# Altium footprint library My Footprint 3D.PCBLIB: 447 footprints (part 16 of 29)
Each footprint in its own frame and in the unit in brackets; x right, y up, seen from the top. Pads: shape width x height; smd on the part's side, far side on the other; paste and mask are expansions set on the pad; w line width, h text height; cw(c..) or ccw(c..) is an arc to the next point about the centre after c.
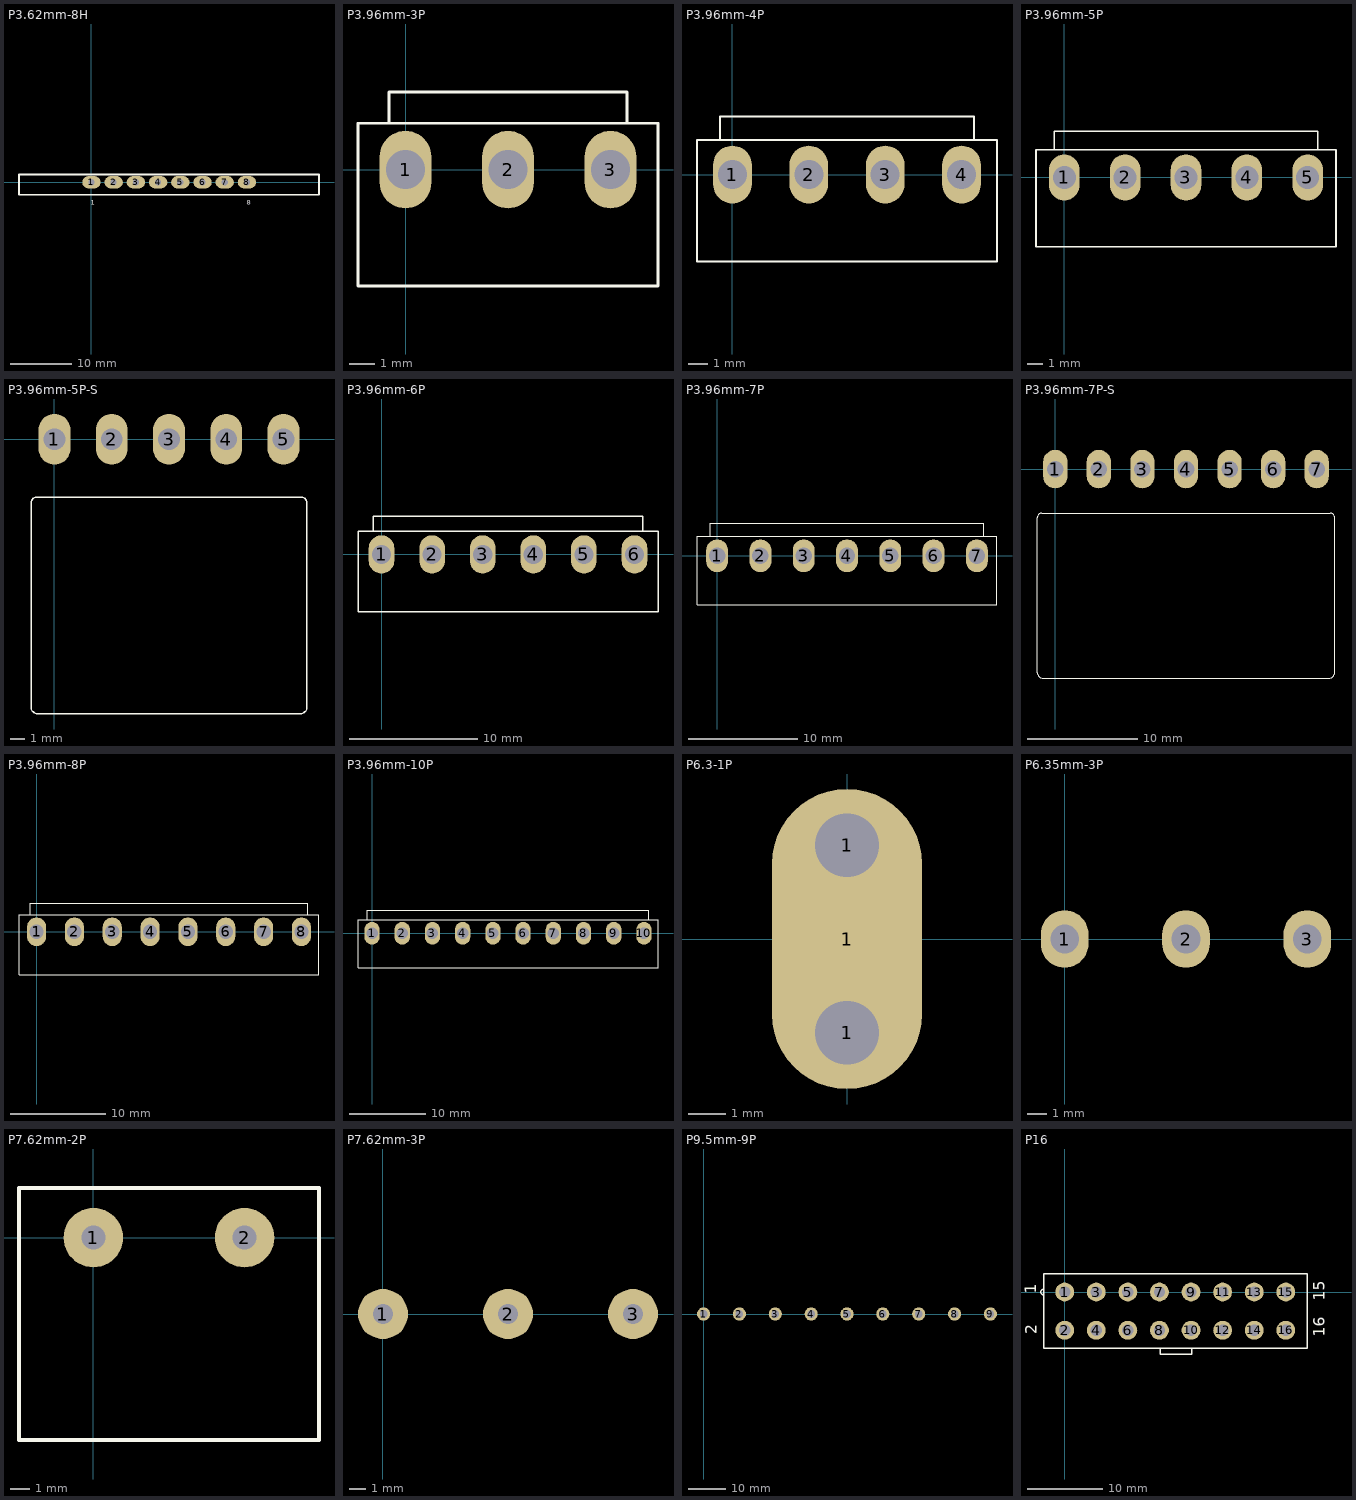
[diagram p15: the footprints below, top view; thin cyan lines are the x and y axes]

## P3.62mm-8H [mm]
pads (8):
  oval 3x2 hole 1: 1(0,0) 2(3.62,0) 3(7.24,0) 4(10.86,0) 5(14.48,0) 6(18.1,0) 7(21.72,0) 8(25.34,0)
Top Overlay:
  lines w0.254: -11.811,-2.032 37.084,-2.032 37.084,1.27 -11.811,1.27 -11.811,-2.032
  text "1" at -0.127,-3.683 h0.8
  text "8" at 25.273,-3.683 h0.8

## P3.96mm-3P [mm] "Distance 3.96mm"
height 10
pads (3):
  oval 2x3 hole 1.5: 1(0,0) 2(3.96,0) 3(7.92,0)
Top Overlay:
  lines w0.1: -0.64,1.8 -1.84,1.8 -1.84,-4.5 9.76,-4.5 9.76,1.8 8.56,1.8 ; -0.64,1.8 -0.64,3 8.56,3 8.56,1.8 ; -0.64,1.8 8.56,1.8
3D body: height 9, standoff 7.5, extent 5.92,3.1 8.82,3.6
3D body: height 9, standoff 0.4, extent 5.92,2 8.82,3.1
3D body: height 3, standoff 0.4, extent 5.92,-4.7 10.02,2
3D body: height 0.4, standoff 0, extent 5.92,-4.7 7.02,3.1
3D body: height 0.4, standoff 0, extent 8.82,-4.7 10.02,2
3D body: height 11.5, standoff -2, extent 7.37,-0.55 8.47,0.55
3D body: height 9, standoff 7.5, extent -0.9,3.1 2,3.6
3D body: height 9, standoff 0.4, extent -0.9,2 2,3.1
3D body: height 3, standoff 0.4, extent -2.1,-4.7 2,2
3D body: height 0.4, standoff 0, extent 0.9,-4.7 2,3.1
3D body: height 0.4, standoff 0, extent -2.1,-4.7 -0.9,2
3D body: height 11.5, standoff -2, extent -0.55,-0.55 0.55,0.55
3D body: height 11.5, standoff -2, extent 3.41,-0.55 4.51,0.55
3D body: height 0.4, standoff 0, extent 1.96,-4.7 3.06,3.1
3D body: height 0.4, standoff 0, extent 4.86,-4.7 5.96,3.1
3D body: height 3, standoff 0.4, extent 1.96,-4.7 5.96,2
3D body: height 9, standoff 0.4, extent 1.96,2 5.96,3.1
3D body: height 9, standoff 7.5, extent 1.96,3.1 5.96,3.6

## P3.96mm-4P [mm] "Distance 3.96mm"
height 10
pads (4):
  oval 2x3 hole 1.5: 1(0,0) 2(3.96,0) 3(7.92,0) 4(11.88,0)
Top Overlay:
  lines w0.1: -0.64,1.8 12.52,1.8 ; -0.64,1.8 -1.84,1.8 -1.84,-4.5 13.72,-4.5 13.72,1.8 12.52,1.8 ; -0.64,1.8 -0.64,3 12.52,3 12.52,1.8
3D body: height 9, standoff 7.5, extent -0.9,3.1 2,3.6
3D body: height 9, standoff 0.4, extent -0.9,2 2,3.1
3D body: height 3, standoff 0.4, extent -2.1,-4.7 2,2
3D body: height 0.4, standoff 0, extent 0.9,-4.7 2,3.1
3D body: height 0.4, standoff 0, extent -2.1,-4.7 -0.9,2
3D body: height 11.5, standoff -2, extent -0.55,-0.55 0.55,0.55
3D body: height 9, standoff 7.5, extent 9.88,3.1 12.78,3.6
3D body: height 9, standoff 0.4, extent 9.88,2 12.78,3.1
3D body: height 3, standoff 0.4, extent 9.88,-4.7 13.98,2
3D body: height 0.4, standoff 0, extent 9.88,-4.7 10.98,3.1
3D body: height 0.4, standoff 0, extent 12.78,-4.7 13.98,2
3D body: height 11.5, standoff -2, extent 11.33,-0.55 12.43,0.55
3D body: height 11.5, standoff -2, extent 3.41,-0.55 4.51,0.55
3D body: height 0.4, standoff 0, extent 1.96,-4.7 3.06,3.1
3D body: height 0.4, standoff 0, extent 4.86,-4.7 5.96,3.1
3D body: height 3, standoff 0.4, extent 1.96,-4.7 5.96,2
3D body: height 9, standoff 0.4, extent 1.96,2 5.96,3.1
3D body: height 9, standoff 7.5, extent 1.96,3.1 5.96,3.6
3D body: height 11.5, standoff -2, extent 7.37,-0.55 8.47,0.55
3D body: height 0.4, standoff 0, extent 5.92,-4.7 7.02,3.1
3D body: height 0.4, standoff 0, extent 8.82,-4.7 9.92,3.1
3D body: height 3, standoff 0.4, extent 5.92,-4.7 9.92,2
3D body: height 9, standoff 0.4, extent 5.92,2 9.92,3.1
3D body: height 9, standoff 7.5, extent 5.92,3.1 9.92,3.6

## P3.96mm-5P [mm]
pads (5):
  oval 2x3 hole 1.5: 1(0,0) 2(3.96,0) 3(7.92,0) 4(11.88,0) 5(15.84,0)
Top Overlay:
  lines w0.1: -0.64,1.8 -0.64,3 16.48,3 16.48,1.8 ; -0.64,1.8 -1.84,1.8 -1.84,-4.5 17.68,-4.5 17.68,1.8 16.48,1.8 ; -0.64,1.8 16.48,1.8
3D body: height 11.5, standoff -2, extent 3.41,-0.55 4.51,0.55
3D body: height 0.4, standoff 0, extent 1.96,-4.7 3.06,3.1
3D body: height 0.4, standoff 0, extent 4.86,-4.7 5.96,3.1
3D body: height 3, standoff 0.4, extent 1.96,-4.7 5.96,2
3D body: height 9, standoff 0.4, extent 1.96,2 5.96,3.1
3D body: height 9, standoff 7.5, extent 1.96,3.1 5.96,3.6
3D body: height 11.5, standoff -2, extent 7.37,-0.55 8.47,0.55
3D body: height 0.4, standoff 0, extent 5.92,-4.7 7.02,3.1
3D body: height 0.4, standoff 0, extent 8.82,-4.7 9.92,3.1
3D body: height 3, standoff 0.4, extent 5.92,-4.7 9.92,2
3D body: height 9, standoff 0.4, extent 5.92,2 9.92,3.1
3D body: height 9, standoff 7.5, extent 5.92,3.1 9.92,3.6
3D body: height 11.5, standoff -2, extent 11.33,-0.55 12.43,0.55
3D body: height 0.4, standoff 0, extent 9.88,-4.7 10.98,3.1
3D body: height 0.4, standoff 0, extent 12.78,-4.7 13.88,3.1
3D body: height 3, standoff 0.4, extent 9.88,-4.7 13.88,2
3D body: height 9, standoff 0.4, extent 9.88,2 13.88,3.1
3D body: height 9, standoff 7.5, extent 9.88,3.1 13.88,3.6
3D body: height 11.5, standoff -2, extent -0.55,-0.55 0.55,0.55
3D body: height 0.4, standoff 0, extent -2.1,-4.7 -0.9,2
3D body: height 0.4, standoff 0, extent 0.9,-4.7 2,3.1
3D body: height 3, standoff 0.4, extent -2.1,-4.7 2,2
3D body: height 9, standoff 0.4, extent -0.9,2 2,3.1
3D body: height 9, standoff 7.5, extent -0.9,3.1 2,3.6
3D body: height 11.5, standoff -2, extent 15.29,-0.55 16.39,0.55
3D body: height 0.4, standoff 0, extent 16.74,-4.7 17.94,2
3D body: height 0.4, standoff 0, extent 13.84,-4.7 14.94,3.1
3D body: height 3, standoff 0.4, extent 13.84,-4.7 17.94,2
3D body: height 9, standoff 0.4, extent 13.84,2 16.74,3.1
3D body: height 9, standoff 7.5, extent 13.84,3.1 16.74,3.6

## P3.96mm-5P-S [mm]
pads (5):
  oval 2.2x3.5 hole 1.5: 1(0,0) 2(3.96,0) 3(7.92,0) 4(11.88,0) 5(15.84,0)
Top Overlay:
  lines w0.1: 16.96,-19 ccw(c16.96,-18.5) 17.46,-18.5 17.46,-4.4 ccw(c17.06,-4.4) 17.06,-4 ; 16.98,-19 -1.12,-19 cw(c-1.12,-18.5) -1.62,-18.5 -1.62,-4.4 cw(c-1.22,-4.4) -1.22,-4 17.08,-4
3D body: height 8, standoff 0, extent 13.84,-6.95 17.84,-3.75
3D body: height 8, standoff 6.9, extent 13.84,-13.25 16.84,-3.75
3D body: height 8.5, standoff 8, extent 13.84,-13.25 16.84,-12.25
3D body: height 1, standoff -1, extent -2,-20.55 17.84,-19.4
3D body: height 8.5, standoff 8, extent -1,-13.25 2,-12.25
3D body: height 8, standoff 6.9, extent -1,-13.25 2,-3.75
3D body: height 5.35, standoff -2, extent 15.29,-0.55 16.39,0.55
3D body: height 5.35, standoff 4.25, extent 15.29,-14.65 16.39,0.55
3D body: height 5.35, standoff -2, extent 11.33,-0.55 12.43,0.55
3D body: height 5.35, standoff 4.25, extent 11.33,-14.65 12.43,0.55
3D body: height 8.5, standoff 8, extent 9.88,-13.25 13.88,-12.25
3D body: height 8, standoff 6.9, extent 9.88,-13.25 13.88,-3.75
3D body: height 8, standoff 0, extent 9.88,-6.95 13.88,-3.75
3D body: height 5.35, standoff -2, extent 7.37,-0.55 8.47,0.55
3D body: height 5.35, standoff 4.25, extent 7.37,-14.65 8.47,0.55
3D body: height 8.5, standoff 8, extent 5.92,-13.25 9.92,-12.25
3D body: height 8, standoff 6.9, extent 5.92,-13.25 9.92,-3.75
3D body: height 8, standoff 0, extent 5.92,-6.95 9.92,-3.75
3D body: height 5.35, standoff -2, extent -0.55,-0.55 0.55,0.55
3D body: height 5.35, standoff 4.25, extent -0.55,-14.65 0.55,0.55
3D body: height 8, standoff 0, extent -2,-6.95 2,-3.75
3D body: height 8, standoff 0, extent 1.96,-6.95 5.96,-3.75
3D body: height 8, standoff 6.9, extent 1.96,-13.25 5.96,-3.75
3D body: height 8.5, standoff 8, extent 1.96,-13.25 5.96,-12.25
3D body: height 5.35, standoff 4.25, extent 3.41,-14.65 4.51,0.55
3D body: height 5.35, standoff -2, extent 3.41,-0.55 4.51,0.55
3D body: height 5.8, standoff 0, extent -2,-20.55 17.84,-6.95
3D body: height 10, standoff 8.8, extent 3.67,-17.25 12.17,-9.25

## P3.96mm-6P [mm] "Distance 3.96mm"
height 10
pads (6):
  oval 2x3 hole 1.5: 1(0,0) 2(3.96,0) 3(7.92,0) 4(11.88,0) 5(15.84,0) 6(19.8,0)
Top Overlay:
  lines w0.1: -0.64,1.8 -0.64,3 20.44,3 20.44,1.8 ; -0.64,1.8 -1.84,1.8 -1.84,-4.5 21.64,-4.5 21.64,1.8 20.44,1.8 ; -0.64,1.8 20.44,1.8
3D body: height 11.5, standoff -2, extent 3.41,-0.55 4.51,0.55
3D body: height 0.4, standoff 0, extent 1.96,-4.7 3.06,3.1
3D body: height 0.4, standoff 0, extent 4.86,-4.7 5.96,3.1
3D body: height 3, standoff 0.4, extent 1.96,-4.7 5.96,2
3D body: height 9, standoff 0.4, extent 1.96,2 5.96,3.1
3D body: height 9, standoff 7.5, extent 1.96,3.1 5.96,3.6
3D body: height 11.5, standoff -2, extent 7.37,-0.55 8.47,0.55
3D body: height 0.4, standoff 0, extent 5.92,-4.7 7.02,3.1
3D body: height 0.4, standoff 0, extent 8.82,-4.7 9.92,3.1
3D body: height 3, standoff 0.4, extent 5.92,-4.7 9.92,2
3D body: height 9, standoff 0.4, extent 5.92,2 9.92,3.1
3D body: height 9, standoff 7.5, extent 5.92,3.1 9.92,3.6
3D body: height 11.5, standoff -2, extent 11.33,-0.55 12.43,0.55
3D body: height 0.4, standoff 0, extent 9.88,-4.7 10.98,3.1
3D body: height 0.4, standoff 0, extent 12.78,-4.7 13.88,3.1
3D body: height 3, standoff 0.4, extent 9.88,-4.7 13.88,2
3D body: height 9, standoff 0.4, extent 9.88,2 13.88,3.1
3D body: height 9, standoff 7.5, extent 9.88,3.1 13.88,3.6
3D body: height 11.5, standoff -2, extent 15.29,-0.55 16.39,0.55
3D body: height 0.4, standoff 0, extent 13.84,-4.7 14.94,3.1
3D body: height 0.4, standoff 0, extent 16.74,-4.7 17.84,3.1
3D body: height 3, standoff 0.4, extent 13.84,-4.7 17.84,2
3D body: height 9, standoff 0.4, extent 13.84,2 17.84,3.1
3D body: height 9, standoff 7.5, extent 13.84,3.1 17.84,3.6
3D body: height 11.5, standoff -2, extent 19.25,-0.55 20.35,0.55
3D body: height 0.4, standoff 0, extent 20.7,-4.7 21.9,2
3D body: height 0.4, standoff 0, extent 17.8,-4.7 18.9,3.1
3D body: height 3, standoff 0.4, extent 17.8,-4.7 21.9,2
3D body: height 9, standoff 0.4, extent 17.8,2 20.7,3.1
3D body: height 9, standoff 7.5, extent 17.8,3.1 20.7,3.6
3D body: height 11.5, standoff -2, extent -0.55,-0.55 0.55,0.55
3D body: height 0.4, standoff 0, extent -2.1,-4.7 -0.9,2
3D body: height 0.4, standoff 0, extent 0.9,-4.7 2,3.1
3D body: height 3, standoff 0.4, extent -2.1,-4.7 2,2
3D body: height 9, standoff 0.4, extent -0.9,2 2,3.1
3D body: height 9, standoff 7.5, extent -0.9,3.1 2,3.6

## P3.96mm-7P [mm]
pads (7):
  oval 2x3 hole 1.5: 1(0,0) 2(3.96,0) 3(7.92,0) 4(11.88,0) 5(15.84,0) 6(19.8,0) 7(23.76,0)
Top Overlay:
  lines w0.1: -0.64,1.8 -0.64,3 24.4,3 24.4,1.8 ; -0.64,1.8 -1.84,1.8 -1.84,-4.5 25.6,-4.5 25.6,1.8 24.4,1.8 ; -0.64,1.8 24.4,1.8
3D body: height 11.5, standoff -2, extent 3.41,-0.55 4.51,0.55
3D body: height 0.4, standoff 0, extent 1.96,-4.7 3.06,3.1
3D body: height 0.4, standoff 0, extent 4.86,-4.7 5.96,3.1
3D body: height 3, standoff 0.4, extent 1.96,-4.7 5.96,2
3D body: height 9, standoff 0.4, extent 1.96,2 5.96,3.1
3D body: height 9, standoff 7.5, extent 1.96,3.1 5.96,3.6
3D body: height 11.5, standoff -2, extent 7.37,-0.55 8.47,0.55
3D body: height 0.4, standoff 0, extent 5.92,-4.7 7.02,3.1
3D body: height 0.4, standoff 0, extent 8.82,-4.7 9.92,3.1
3D body: height 3, standoff 0.4, extent 5.92,-4.7 9.92,2
3D body: height 9, standoff 0.4, extent 5.92,2 9.92,3.1
3D body: height 9, standoff 7.5, extent 5.92,3.1 9.92,3.6
3D body: height 11.5, standoff -2, extent 11.33,-0.55 12.43,0.55
3D body: height 0.4, standoff 0, extent 9.88,-4.7 10.98,3.1
3D body: height 0.4, standoff 0, extent 12.78,-4.7 13.88,3.1
3D body: height 3, standoff 0.4, extent 9.88,-4.7 13.88,2
3D body: height 9, standoff 0.4, extent 9.88,2 13.88,3.1
3D body: height 9, standoff 7.5, extent 9.88,3.1 13.88,3.6
3D body: height 11.5, standoff -2, extent 15.29,-0.55 16.39,0.55
3D body: height 0.4, standoff 0, extent 13.84,-4.7 14.94,3.1
3D body: height 0.4, standoff 0, extent 16.74,-4.7 17.84,3.1
3D body: height 3, standoff 0.4, extent 13.84,-4.7 17.84,2
3D body: height 9, standoff 0.4, extent 13.84,2 17.84,3.1
3D body: height 9, standoff 7.5, extent 13.84,3.1 17.84,3.6
3D body: height 11.5, standoff -2, extent 19.25,-0.55 20.35,0.55
3D body: height 0.4, standoff 0, extent 17.8,-4.7 18.9,3.1
3D body: height 0.4, standoff 0, extent 20.7,-4.7 21.8,3.1
3D body: height 3, standoff 0.4, extent 17.8,-4.7 21.8,2
3D body: height 9, standoff 0.4, extent 17.8,2 21.8,3.1
3D body: height 9, standoff 7.5, extent 17.8,3.1 21.8,3.6
3D body: height 11.5, standoff -2, extent -0.55,-0.55 0.55,0.55
3D body: height 0.4, standoff 0, extent -2.1,-4.7 -0.9,2
3D body: height 0.4, standoff 0, extent 0.9,-4.7 2,3.1
3D body: height 3, standoff 0.4, extent -2.1,-4.7 2,2
3D body: height 9, standoff 0.4, extent -0.9,2 2,3.1
3D body: height 9, standoff 7.5, extent -0.9,3.1 2,3.6
3D body: height 11.5, standoff -2, extent 23.21,-0.55 24.31,0.55
3D body: height 0.4, standoff 0, extent 24.66,-4.7 25.86,2
3D body: height 0.4, standoff 0, extent 21.76,-4.7 22.86,3.1
3D body: height 3, standoff 0.4, extent 21.76,-4.7 25.86,2
3D body: height 9, standoff 0.4, extent 21.76,2 24.66,3.1
3D body: height 9, standoff 7.5, extent 21.76,3.1 24.66,3.6

## P3.96mm-7P-S [mm]
pads (7):
  oval 2.2x3.5 hole 1.5: 1(0,0) 2(3.96,0) 3(7.92,0) 4(11.88,0) 5(15.84,0) 6(19.8,0) 7(23.76,0)
Top Overlay:
  lines w0.1: -1.62,-18.5 ccw(c-1.12,-18.5) -1.12,-19 24.88,-19 ccw(c24.88,-18.5) 25.38,-18.5 25.38,-4.4 ccw(c24.98,-4.4) 24.98,-4 -1.22,-4 ccw(c-1.22,-4.4) -1.62,-4.4 -1.62,-18.5
3D body: height 10, standoff 8.8, extent 7.63,-17.25 16.13,-9.25
3D body: height 5.8, standoff 0, extent -2.02,-20.65 25.78,-7.05
3D body: height 5.35, standoff -2, extent 3.41,-0.55 4.51,0.55
3D body: height 5.35, standoff 4.25, extent 3.41,-14.65 4.51,0.55
3D body: height 8.5, standoff 8, extent 1.96,-13.25 5.96,-12.25
3D body: height 8, standoff 6.9, extent 1.96,-13.25 5.96,-3.75
3D body: height 8, standoff 0, extent 1.96,-6.95 5.96,-3.75
3D body: height 8, standoff 0, extent -2,-6.95 2,-3.75
3D body: height 5.35, standoff 4.25, extent -0.55,-14.65 0.55,0.55
3D body: height 5.35, standoff -2, extent -0.55,-0.55 0.55,0.55
3D body: height 8, standoff 0, extent 5.92,-6.95 9.92,-3.75
3D body: height 8, standoff 6.9, extent 5.92,-13.25 9.92,-3.75
3D body: height 8.5, standoff 8, extent 5.92,-13.25 9.92,-12.25
3D body: height 5.35, standoff 4.25, extent 7.37,-14.65 8.47,0.55
3D body: height 5.35, standoff -2, extent 7.37,-0.55 8.47,0.55
3D body: height 8, standoff 0, extent 9.88,-6.95 13.88,-3.75
3D body: height 8, standoff 6.9, extent 9.88,-13.25 13.88,-3.75
3D body: height 8.5, standoff 8, extent 9.88,-13.25 13.88,-12.25
3D body: height 5.35, standoff 4.25, extent 11.33,-14.65 12.43,0.55
3D body: height 5.35, standoff -2, extent 11.33,-0.55 12.43,0.55
3D body: height 8, standoff 0, extent 13.84,-6.95 17.84,-3.75
3D body: height 8, standoff 6.9, extent 13.84,-13.25 17.84,-3.75
3D body: height 8.5, standoff 8, extent 13.84,-13.25 17.84,-12.25
3D body: height 5.35, standoff 4.25, extent 15.29,-14.65 16.39,0.55
3D body: height 5.35, standoff -2, extent 15.29,-0.55 16.39,0.55
3D body: height 8, standoff 0, extent 17.8,-6.95 21.8,-3.75
3D body: height 8, standoff 6.9, extent 17.8,-13.25 21.8,-3.75
3D body: height 8.5, standoff 8, extent 17.8,-13.25 21.8,-12.25
3D body: height 5.35, standoff 4.25, extent 19.25,-14.65 20.35,0.55
3D body: height 5.35, standoff -2, extent 19.25,-0.55 20.35,0.55
3D body: height 8, standoff 0, extent 21.76,-6.95 25.76,-3.75
3D body: height 5.35, standoff 4.25, extent 23.21,-14.65 24.31,0.55
3D body: height 5.35, standoff -2, extent 23.21,-0.55 24.31,0.55
3D body: height 8, standoff 6.9, extent -1,-13.25 2,-3.75
3D body: height 8.5, standoff 8, extent -1,-13.25 2,-12.25
3D body: height 8.5, standoff 8, extent 21.76,-13.25 24.76,-12.25
3D body: height 8, standoff 6.9, extent 21.76,-13.25 24.76,-3.75
3D body: height 1, standoff -1, extent -2.02,-20.65 25.78,-19.5

## P3.96mm-8P [mm]
pads (8):
  oval 2x3 hole 1.5: 1(0,0) 2(3.96,0) 3(7.92,0) 4(11.88,0) 5(15.84,0) 6(19.8,0) 7(23.76,0) 8(27.72,0)
Top Overlay:
  lines w0.1: -0.64,1.8 -1.84,1.8 -1.84,-4.5 29.56,-4.5 29.56,1.8 28.36,1.8 ; -0.64,1.8 -0.64,3 28.36,3 28.36,1.8 ; -0.64,1.8 28.36,1.8
3D body: height 9, standoff 7.5, extent -0.9,3.1 2,3.6
3D body: height 9, standoff 0.4, extent -0.9,2 2,3.1
3D body: height 3, standoff 0.4, extent -2.1,-4.7 2,2
3D body: height 0.4, standoff 0, extent 0.9,-4.7 2,3.1
3D body: height 0.4, standoff 0, extent -2.1,-4.7 -0.9,2
3D body: height 11.5, standoff -2, extent -0.55,-0.55 0.55,0.55
3D body: height 11.5, standoff -2, extent 3.41,-0.55 4.51,0.55
3D body: height 0.4, standoff 0, extent 1.96,-4.7 3.06,3.1
3D body: height 0.4, standoff 0, extent 4.86,-4.7 5.96,3.1
3D body: height 3, standoff 0.4, extent 1.96,-4.7 5.96,2
3D body: height 9, standoff 0.4, extent 1.96,2 5.96,3.1
3D body: height 9, standoff 7.5, extent 1.96,3.1 5.96,3.6
3D body: height 11.5, standoff -2, extent 7.37,-0.55 8.47,0.55
3D body: height 0.4, standoff 0, extent 5.92,-4.7 7.02,3.1
3D body: height 0.4, standoff 0, extent 8.82,-4.7 9.92,3.1
3D body: height 3, standoff 0.4, extent 5.92,-4.7 9.92,2
3D body: height 9, standoff 0.4, extent 5.92,2 9.92,3.1
3D body: height 9, standoff 7.5, extent 5.92,3.1 9.92,3.6
3D body: height 11.5, standoff -2, extent 11.33,-0.55 12.43,0.55
3D body: height 0.4, standoff 0, extent 9.88,-4.7 10.98,3.1
3D body: height 0.4, standoff 0, extent 12.78,-4.7 13.88,3.1
3D body: height 3, standoff 0.4, extent 9.88,-4.7 13.88,2
3D body: height 9, standoff 0.4, extent 9.88,2 13.88,3.1
3D body: height 9, standoff 7.5, extent 9.88,3.1 13.88,3.6
3D body: height 11.5, standoff -2, extent 15.29,-0.55 16.39,0.55
3D body: height 0.4, standoff 0, extent 13.84,-4.7 14.94,3.1
3D body: height 0.4, standoff 0, extent 16.74,-4.7 17.84,3.1
3D body: height 3, standoff 0.4, extent 13.84,-4.7 17.84,2
3D body: height 9, standoff 0.4, extent 13.84,2 17.84,3.1
3D body: height 9, standoff 7.5, extent 13.84,3.1 17.84,3.6
3D body: height 11.5, standoff -2, extent 19.25,-0.55 20.35,0.55
3D body: height 0.4, standoff 0, extent 17.8,-4.7 18.9,3.1
3D body: height 0.4, standoff 0, extent 20.7,-4.7 21.8,3.1
3D body: height 3, standoff 0.4, extent 17.8,-4.7 21.8,2
3D body: height 9, standoff 0.4, extent 17.8,2 21.8,3.1
3D body: height 9, standoff 7.5, extent 17.8,3.1 21.8,3.6
3D body: height 11.5, standoff -2, extent 23.21,-0.55 24.31,0.55
3D body: height 0.4, standoff 0, extent 21.76,-4.7 22.86,3.1
3D body: height 0.4, standoff 0, extent 24.66,-4.7 25.76,3.1
3D body: height 3, standoff 0.4, extent 21.76,-4.7 25.76,2
3D body: height 9, standoff 0.4, extent 21.76,2 25.76,3.1
3D body: height 9, standoff 7.5, extent 21.76,3.1 25.76,3.6
3D body: height 11.5, standoff -2, extent 27.17,-0.55 28.27,0.55
3D body: height 0.4, standoff 0, extent 28.62,-4.7 29.82,2
3D body: height 0.4, standoff 0, extent 25.72,-4.7 26.82,3.1
3D body: height 3, standoff 0.4, extent 25.72,-4.7 29.82,2
3D body: height 9, standoff 0.4, extent 25.72,2 28.62,3.1
3D body: height 9, standoff 7.5, extent 25.72,3.1 28.62,3.6

## P3.96mm-10P [mm]
pads (10):
  oval 2x3 hole 1.5: 1(0,0) 2(3.96,0) 3(7.92,0) 4(11.88,0) 5(15.84,0) 6(19.8,0) 7(23.76,0) 8(27.72,0) 9(31.68,0) 10(35.64,0)
Top Overlay:
  lines w0.1: -0.64,1.8 -0.64,3 36.28,3 36.28,1.8 ; -0.64,1.8 -1.84,1.8 -1.84,-4.5 37.48,-4.5 37.48,1.8 36.28,1.8 ; -0.64,1.8 36.28,1.8
3D body: height 11.5, standoff -2, extent 3.41,-0.55 4.51,0.55
3D body: height 0.4, standoff 0, extent 1.96,-4.7 3.06,3.1
3D body: height 0.4, standoff 0, extent 4.86,-4.7 5.96,3.1
3D body: height 3, standoff 0.4, extent 1.96,-4.7 5.96,2
3D body: height 9, standoff 0.4, extent 1.96,2 5.96,3.1
3D body: height 9, standoff 7.5, extent 1.96,3.1 5.96,3.6
3D body: height 11.5, standoff -2, extent 7.37,-0.55 8.47,0.55
3D body: height 0.4, standoff 0, extent 5.92,-4.7 7.02,3.1
3D body: height 0.4, standoff 0, extent 8.82,-4.7 9.92,3.1
3D body: height 3, standoff 0.4, extent 5.92,-4.7 9.92,2
3D body: height 9, standoff 0.4, extent 5.92,2 9.92,3.1
3D body: height 9, standoff 7.5, extent 5.92,3.1 9.92,3.6
3D body: height 11.5, standoff -2, extent 11.33,-0.55 12.43,0.55
3D body: height 0.4, standoff 0, extent 9.88,-4.7 10.98,3.1
3D body: height 0.4, standoff 0, extent 12.78,-4.7 13.88,3.1
3D body: height 3, standoff 0.4, extent 9.88,-4.7 13.88,2
3D body: height 9, standoff 0.4, extent 9.88,2 13.88,3.1
3D body: height 9, standoff 7.5, extent 9.88,3.1 13.88,3.6
3D body: height 11.5, standoff -2, extent 15.29,-0.55 16.39,0.55
3D body: height 0.4, standoff 0, extent 13.84,-4.7 14.94,3.1
3D body: height 0.4, standoff 0, extent 16.74,-4.7 17.84,3.1
3D body: height 3, standoff 0.4, extent 13.84,-4.7 17.84,2
3D body: height 9, standoff 0.4, extent 13.84,2 17.84,3.1
3D body: height 9, standoff 7.5, extent 13.84,3.1 17.84,3.6
3D body: height 11.5, standoff -2, extent 19.25,-0.55 20.35,0.55
3D body: height 0.4, standoff 0, extent 17.8,-4.7 18.9,3.1
3D body: height 0.4, standoff 0, extent 20.7,-4.7 21.8,3.1
3D body: height 3, standoff 0.4, extent 17.8,-4.7 21.8,2
3D body: height 9, standoff 0.4, extent 17.8,2 21.8,3.1
3D body: height 9, standoff 7.5, extent 17.8,3.1 21.8,3.6
3D body: height 11.5, standoff -2, extent 23.21,-0.55 24.31,0.55
3D body: height 0.4, standoff 0, extent 21.76,-4.7 22.86,3.1
3D body: height 0.4, standoff 0, extent 24.66,-4.7 25.76,3.1
3D body: height 3, standoff 0.4, extent 21.76,-4.7 25.76,2
3D body: height 9, standoff 0.4, extent 21.76,2 25.76,3.1
3D body: height 9, standoff 7.5, extent 21.76,3.1 25.76,3.6
3D body: height 11.5, standoff -2, extent 27.17,-0.55 28.27,0.55
3D body: height 0.4, standoff 0, extent 25.72,-4.7 26.82,3.1
3D body: height 0.4, standoff 0, extent 28.62,-4.7 29.72,3.1
3D body: height 3, standoff 0.4, extent 25.72,-4.7 29.72,2
3D body: height 9, standoff 0.4, extent 25.72,2 29.72,3.1
3D body: height 9, standoff 7.5, extent 25.72,3.1 29.72,3.6
3D body: height 11.5, standoff -2, extent 31.13,-0.55 32.23,0.55
3D body: height 0.4, standoff 0, extent 29.68,-4.7 30.78,3.1
3D body: height 0.4, standoff 0, extent 32.58,-4.7 33.68,3.1
3D body: height 3, standoff 0.4, extent 29.68,-4.7 33.68,2
3D body: height 9, standoff 0.4, extent 29.68,2 33.68,3.1
3D body: height 9, standoff 7.5, extent 29.68,3.1 33.68,3.6
3D body: height 11.5, standoff -2, extent 35.09,-0.55 36.19,0.55
3D body: height 0.4, standoff 0, extent 36.54,-4.7 37.74,2
3D body: height 0.4, standoff 0, extent 33.64,-4.7 34.74,3.1
3D body: height 3, standoff 0.4, extent 33.64,-4.7 37.74,2
3D body: height 9, standoff 0.4, extent 33.64,2 36.54,3.1
3D body: height 9, standoff 7.5, extent 33.64,3.1 36.54,3.6
3D body: height 11.5, standoff -2, extent -0.55,-0.55 0.55,0.55
3D body: height 0.4, standoff 0, extent -2.1,-4.7 -0.9,2
3D body: height 0.4, standoff 0, extent 0.9,-4.7 2,3.1
3D body: height 3, standoff 0.4, extent -2.1,-4.7 2,2
3D body: height 9, standoff 0.4, extent -0.9,2 2,3.1
3D body: height 9, standoff 7.5, extent -0.9,3.1 2,3.6

## P6.3-1P [mm]
height 3.71
pads (3):
  round 2.7 hole 1.7: 1(0,-2.5) 1(0,2.5)
  oval 4x8 all layers, no hole: 1(0,0)

## P6.35mm-3P [mm]
pads (3):
  oval 2.5x3 hole 1.5: 1(0,0) 2(6.35,0) 3(12.7,0)
3D body: height 13, standoff 0, extent 15.275,-10 16.475,4.2
3D body: height 7.3, standoff 6.5, extent 10.3,-7 15.1,-1
3D body: height 13, standoff 8, extent 9.525,1.5 15.875,2.5
3D body: height 6.5, standoff 0.7, extent 9.525,-10 15.875,1.5
3D body: height 13, standoff 0, extent 8.925,-10 10.125,4.2
3D body: height 13, standoff 12, extent 9.525,1.5 15.875,4.2
3D body: height 10.1, standoff 8.3, extent 10.418,-6.295 15,-1.704
3D body: height 2, standoff -2, extent 12.15,-0.4 13.25,0.4
3D body: height 7.3, standoff 6.5, extent 10.3,-6.8 15.1,-1.2
3D body: height 7.3, standoff 6.5, extent 11.3,-1 14.1,0
3D body: height 7.3, standoff 6.5, extent 11.3,-8 14.1,-7
3D body: height 10.11, standoff 9.11, extent 10.418,-4.5 15.018,-3.5
3D body: height 10.11, standoff 9.11, extent 12.209,-6.295 13.209,-1.695
3D body: height 7.3, standoff 6.5, extent 3.95,-7 8.75,-1
3D body: height 13, standoff 8, extent 3.175,1.5 9.525,2.5
3D body: height 6.5, standoff 0.7, extent 3.175,-10 9.525,1.5
3D body: height 13, standoff 0, extent 2.575,-10 3.775,4.2
3D body: height 13, standoff 12, extent 3.175,1.5 9.525,4.2
3D body: height 10.1, standoff 8.3, extent 4.068,-6.295 8.65,-1.704
3D body: height 2, standoff -2, extent 5.8,-0.4 6.9,0.4
3D body: height 7.3, standoff 6.5, extent 3.95,-6.8 8.75,-1.2
3D body: height 7.3, standoff 6.5, extent 4.95,-1 7.75,0
3D body: height 7.3, standoff 6.5, extent 4.95,-8 7.75,-7
3D body: height 10.11, standoff 9.11, extent 4.068,-4.5 8.668,-3.5
3D body: height 10.11, standoff 9.11, extent 5.859,-6.295 6.859,-1.695
3D body: height 10.11, standoff 9.11, extent -0.491,-6.295 0.509,-1.695
3D body: height 10.11, standoff 9.11, extent -2.282,-4.5 2.318,-3.5
3D body: height 7.3, standoff 6.5, extent -1.4,-8 1.4,-7
3D body: height 7.3, standoff 6.5, extent -1.4,-1 1.4,0
3D body: height 7.3, standoff 6.5, extent -2.4,-6.8 2.4,-1.2
3D body: height 2, standoff -2, extent -0.55,-0.4 0.55,0.4
3D body: height 10.1, standoff 8.3, extent -2.282,-6.295 2.3,-1.704
3D body: height 13, standoff 12, extent -3.175,1.5 3.175,4.2
3D body: height 13, standoff 0, extent -3.775,-10 -2.575,4.2
3D body: height 6.5, standoff 0.7, extent -3.175,-10 3.175,1.5
3D body: height 13, standoff 8, extent -3.175,1.5 3.175,2.5
3D body: height 7.3, standoff 6.5, extent -2.4,-7 2.4,-1

## P7.62mm-2P [mm]
height 5.08
pads (2):
  round 3 hole 1.2: 1(0,0) 2(7.62,0)
Top Overlay:
  lines w0.2: 11.37,-10.2 11.37,2.5 ; 11.375,-10.2 -3.75,-10.2 -3.75,2.5 11.375,2.5

## P7.62mm-3P [mm]
height 5.08
pads (3):
  round 3 hole 1.2: 1(0,0) 2(7.5,0) 3(15,0)

## P9.5mm-9P [mm]
pads (9):
  round 3.5 hole 2: 1(0,0) 2(9.5,0) 3(19,0) 4(28.5,0) 5(38,0) 6(47.5,0) 7(57,0) 8(66.5,0) 9(76,0)
3D body: height 14, standoff 0, extent 80.15,-13 81.35,4.5
3D body: height 2, standoff -2, extent 75.3,-0.4 76.7,0.4
3D body: height 12, standoff 9, extent 72.528,-8.993 79.5,-2.007
3D body: height 9, standoff 7, extent 72.2,-9.7 79.8,-1.3
3D body: height 14, standoff 13, extent 70.6,1.5 80.75,4.5
3D body: height 14, standoff 0, extent 70.65,-13 71.85,4.5
3D body: height 7, standoff 0.8, extent 71.25,-13 80.75,1.5
3D body: height 14, standoff 8, extent 70.6,1.5 80.5,2.5
3D body: height 7.5, standoff 7, extent 72,-10 80,-1
3D body: height 7.5, standoff 7, extent 73,-1 79,0
3D body: height 7.5, standoff 7, extent 73,-11 79,-10
3D body: height 12.01, standoff 11, extent 72.528,-6.05 79.528,-4.95
3D body: height 12.01, standoff 11, extent 75.464,-8.993 76.564,-1.993
3D body: height 2, standoff -2, extent 65.8,-0.4 67.2,0.4
3D body: height 12, standoff 9, extent 63.028,-8.993 70,-2.007
3D body: height 9, standoff 7, extent 62.7,-9.7 70.3,-1.3
3D body: height 14, standoff 13, extent 61.1,1.5 71.25,4.5
3D body: height 14, standoff 0, extent 61.15,-13 62.35,4.5
3D body: height 7, standoff 0.8, extent 61.75,-13 71.25,1.5
3D body: height 14, standoff 8, extent 61.1,1.5 71,2.5
3D body: height 7.5, standoff 7, extent 62.5,-10 70.5,-1
3D body: height 7.5, standoff 7, extent 63.5,-1 69.5,0
3D body: height 7.5, standoff 7, extent 63.5,-11 69.5,-10
3D body: height 12.01, standoff 11, extent 63.028,-6.05 70.028,-4.95
3D body: height 12.01, standoff 11, extent 65.964,-8.993 67.064,-1.993
3D body: height 2, standoff -2, extent 56.3,-0.4 57.7,0.4
3D body: height 12, standoff 9, extent 53.528,-8.993 60.5,-2.007
3D body: height 9, standoff 7, extent 53.2,-9.7 60.8,-1.3
3D body: height 14, standoff 13, extent 51.6,1.5 61.75,4.5
3D body: height 14, standoff 0, extent 51.65,-13 52.85,4.5
3D body: height 7, standoff 0.8, extent 52.25,-13 61.75,1.5
3D body: height 14, standoff 8, extent 51.6,1.5 61.5,2.5
3D body: height 7.5, standoff 7, extent 53,-10 61,-1
3D body: height 7.5, standoff 7, extent 54,-1 60,0
3D body: height 7.5, standoff 7, extent 54,-11 60,-10
3D body: height 12.01, standoff 11, extent 53.528,-6.05 60.528,-4.95
3D body: height 12.01, standoff 11, extent 56.464,-8.993 57.564,-1.993
3D body: height 2, standoff -2, extent 46.8,-0.4 48.2,0.4
3D body: height 12, standoff 9, extent 44.028,-8.993 51,-2.007
3D body: height 9, standoff 7, extent 43.7,-9.7 51.3,-1.3
3D body: height 14, standoff 13, extent 42.1,1.5 52.25,4.5
3D body: height 14, standoff 0, extent 42.15,-13 43.35,4.5
3D body: height 7, standoff 0.8, extent 42.75,-13 52.25,1.5
3D body: height 14, standoff 8, extent 42.1,1.5 52,2.5
3D body: height 7.5, standoff 7, extent 43.5,-10 51.5,-1
3D body: height 7.5, standoff 7, extent 44.5,-1 50.5,0
3D body: height 7.5, standoff 7, extent 44.5,-11 50.5,-10
3D body: height 12.01, standoff 11, extent 44.028,-6.05 51.028,-4.95
3D body: height 12.01, standoff 11, extent 46.964,-8.993 48.064,-1.993
3D body: height 2, standoff -2, extent 37.3,-0.4 38.7,0.4
3D body: height 12, standoff 9, extent 34.528,-8.993 41.5,-2.007
3D body: height 9, standoff 7, extent 34.2,-9.7 41.8,-1.3
3D body: height 14, standoff 13, extent 32.6,1.5 42.75,4.5
3D body: height 14, standoff 0, extent 32.65,-13 33.85,4.5
3D body: height 7, standoff 0.8, extent 33.25,-13 42.75,1.5
3D body: height 14, standoff 8, extent 32.6,1.5 42.5,2.5
3D body: height 7.5, standoff 7, extent 34,-10 42,-1
3D body: height 7.5, standoff 7, extent 35,-1 41,0
3D body: height 7.5, standoff 7, extent 35,-11 41,-10
3D body: height 12.01, standoff 11, extent 34.528,-6.05 41.528,-4.95
3D body: height 12.01, standoff 11, extent 37.464,-8.993 38.564,-1.993
3D body: height 2, standoff -2, extent 27.8,-0.4 29.2,0.4
3D body: height 12, standoff 9, extent 25.028,-8.993 32,-2.007
3D body: height 9, standoff 7, extent 24.7,-9.7 32.3,-1.3
3D body: height 14, standoff 13, extent 23.1,1.5 33.25,4.5
3D body: height 14, standoff 0, extent 23.15,-13 24.35,4.5
3D body: height 7, standoff 0.8, extent 23.75,-13 33.25,1.5
3D body: height 14, standoff 8, extent 23.1,1.5 33,2.5
3D body: height 7.5, standoff 7, extent 24.5,-10 32.5,-1
3D body: height 7.5, standoff 7, extent 25.5,-1 31.5,0
3D body: height 7.5, standoff 7, extent 25.5,-11 31.5,-10
3D body: height 12.01, standoff 11, extent 25.028,-6.05 32.028,-4.95
3D body: height 12.01, standoff 11, extent 27.964,-8.993 29.064,-1.993
3D body: height 2, standoff -2, extent 18.3,-0.4 19.7,0.4
3D body: height 12, standoff 9, extent 15.528,-8.993 22.5,-2.007
3D body: height 9, standoff 7, extent 15.2,-9.7 22.8,-1.3
3D body: height 14, standoff 13, extent 13.6,1.5 23.75,4.5
3D body: height 14, standoff 0, extent 13.65,-13 14.85,4.5
3D body: height 7, standoff 0.8, extent 14.25,-13 23.75,1.5
3D body: height 14, standoff 8, extent 13.6,1.5 23.5,2.5
3D body: height 7.5, standoff 7, extent 15,-10 23,-1
3D body: height 7.5, standoff 7, extent 16,-1 22,0
3D body: height 7.5, standoff 7, extent 16,-11 22,-10
3D body: height 12.01, standoff 11, extent 15.528,-6.05 22.528,-4.95
3D body: height 12.01, standoff 11, extent 18.464,-8.993 19.564,-1.993
3D body: height 2, standoff -2, extent 8.8,-0.4 10.2,0.4
3D body: height 12, standoff 9, extent 6.028,-8.993 13,-2.007
3D body: height 9, standoff 7, extent 5.7,-9.7 13.3,-1.3
3D body: height 14, standoff 13, extent 4.1,1.5 14.25,4.5
3D body: height 14, standoff 0, extent 4.15,-13 5.35,4.5
3D body: height 7, standoff 0.8, extent 4.75,-13 14.25,1.5
3D body: height 14, standoff 8, extent 4.1,1.5 14,2.5
3D body: height 7.5, standoff 7, extent 5.5,-10 13.5,-1
3D body: height 7.5, standoff 7, extent 6.5,-1 12.5,0
3D body: height 7.5, standoff 7, extent 6.5,-11 12.5,-10
3D body: height 12.01, standoff 11, extent 6.028,-6.05 13.028,-4.95
3D body: height 12.01, standoff 11, extent 8.964,-8.993 10.064,-1.993
3D body: height 12.01, standoff 11, extent -0.536,-8.993 0.564,-1.993
3D body: height 12.01, standoff 11, extent -3.472,-6.05 3.528,-4.95
3D body: height 7.5, standoff 7, extent -3,-11 3,-10
3D body: height 7.5, standoff 7, extent -3,-1 3,0
3D body: height 7.5, standoff 7, extent -4,-10 4,-1
3D body: height 14, standoff 8, extent -5.4,1.5 4.5,2.5
3D body: height 7, standoff 0.8, extent -4.75,-13 4.75,1.5
3D body: height 14, standoff 0, extent -5.35,-13 -4.15,4.5
3D body: height 14, standoff 13, extent -5.4,1.5 4.75,4.5
3D body: height 9, standoff 7, extent -3.8,-9.7 3.8,-1.3
3D body: height 12, standoff 9, extent -3.472,-8.993 3.5,-2.007
3D body: height 2, standoff -2, extent -0.7,-0.4 0.7,0.4

## P16 [mm] "Body 10mmX35mm.Pin 5.08mm-4.2mm"
height 14
pads (16):
  round 2.5 hole 1.5: 1(0,0) 2(0,-5.08) 3(4.2,0) 4(4.2,-5.08) 5(8.4,0) 6(8.4,-5.08) 7(12.6,0) 8(12.6,-5.08) 9(16.8,0) 10(16.8,-5.08) 11(21,0) 12(21,-5.08) 13(25.2,0) 14(25.2,-5.08) 15(29.4,0) 16(29.4,-5.08)
Top Overlay:
  lines w0.2: -2.794,-0.381 cw(c-2.794,0) -2.794,0.381 ; 12.7,-7.493 12.7,-8.255 16.891,-8.255 16.891,-7.493 ; -2.794,-7.493 32.258,-7.493 32.258,2.413 -2.794,2.413 -2.794,-7.493
  text "16" at 34.544,-5.969 h1.52
  text "15" at 34.544,-1.143 h1.52
  text "2" at -3.683,-5.588 h1.52
  text "1" at -3.81,-0.254 h1.52